# Altium schematic symbol library LATTICEPLDS_Library.SchLib: 291 symbols (part 24 of 32)
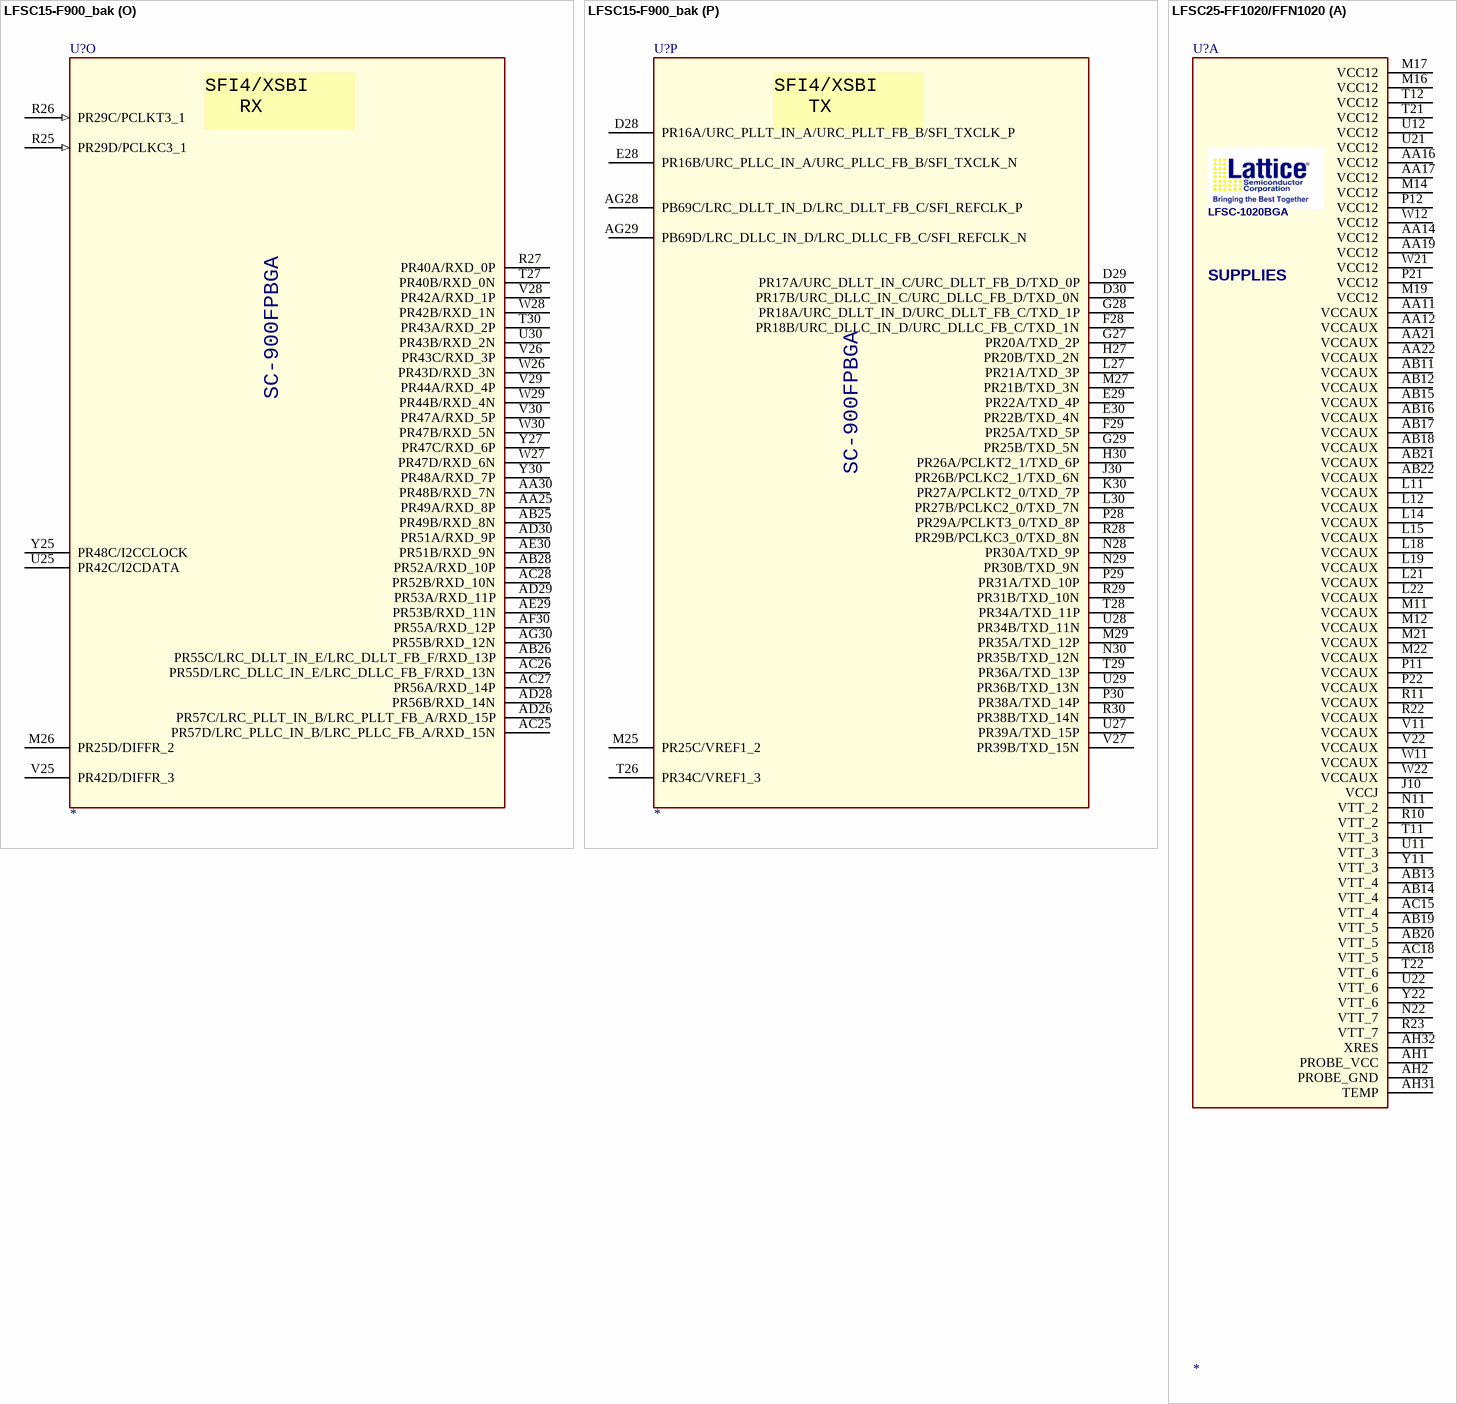
[diagram p326: symbols LFSC15-F900_bak to LFSC25-FF1020/FFN1020]

## LFSC15-F900_bak
designator U?
footprint 1mm-900bga
part A pins: A3 A_HDOUTP0_L (io), A4 A_HDOUTN0_L (io), A5 A_HDOUTN1_L (io), A6 A_HDOUTP1_L (io), A7 A_HDOUTP2_L (io), A8 A_HDOUTN2_L (io), A9 A_HDOUTN3_L (io), A10 A_HDOUTP3_L (io), A17 PT42A/EXTDONEI (io), A21 A_HDOUTP3_R (io), A22 A_HDOUTN3_R (io), A23 A_HDOUTN2_R (io), A24 A_HDOUTP2_R (io), A25 A_HDOUTP1_R (io), A26 A_HDOUTN1_R (io), A27 A_HDOUTN0_R (io), A28 A_HDOUTP0_R (io), B1 A_REFCLKP_L (in), B2 A_RXREFCLKP_L (in), B3 A_HDINP0_L (io), B4 A_HDINN0_L (io), B5 A_HDINN1_L (io), B6 A_HDINP1_L (io), B7 A_HDINP2_L (io), B8 A_HDINN2_L (io), B9 A_HDINN3_L (io), B10 A_HDINP3_L (io), B21 A_HDINP3_R (io), B22 A_HDINN3_R (io), B23 A_HDINN2_R (io), B24 A_HDINP2_R (io), B25 A_HDINP1_R (io), B26 A_HDINN1_R (io), B27 A_HDINN0_R (io), B28 A_HDINP0_R (io), B29 A_RXREFCLKP_R (in), B30 A_REFCLKP_R (in), C1 A_REFCLKN_L (in), C2 A_RXREFCLKN_L (in), C29 A_RXREFCLKN_R (in), C30 A_REFCLKN_R (in), D16 PT39A/EXTCLKP2I (io), D17 PT39B/EXTCLKP2O (io), F17 PT38D/EXTDONEO (io), H17 PT41A/EXTCLKP1I (io), H18 PT41B/EXTCLKP1O (io)
part B pins: C3 A_VDDIB0_L (power), C4 A_VDDOB0_L (power), C5 A_VDDOB1_L (power), C6 A_VDDIB1_L (power), C7 A_VDDIB2_L (power), C8 A_VDDOB2_L (power), C9 A_VDDOB3_L (power), C10 A_VDDIB3_L (power), C21 A_VDDIB3_R (power), C22 A_VDDOB3_R (power), C23 A_VDDOB2_R (power), C24 A_VDDIB2_R (power), C25 A_VDDIB1_R (power), C26 A_VDDOB1_R (power), C27 A_VDDOB0_R (power), C28 A_VDDIB0_R (power), D5 A_VDDP_L (power), D6 A_VDDRX0_L (power), D7 A_VDDTX1_L (power), D8 A_VDDRX2_L (power), D9 A_VDDTX3_L (power), D22 A_VDDTX3_R (power), D23 A_VDDRX2_R (power), D24 A_VDDTX1_R (power), D25 A_VDDRX0_R (power), D26 A_VDDP_R (power), E6 A_VDDTX0_L (power), E7 A_VDDRX1_L (power), E8 A_VDDTX2_L (power), E9 A_VDDRX3_L (power), E22 A_VDDRX3_R (power), E23 A_VDDTX2_R (power), E24 A_VDDRX1_R (power), E25 A_VDDTX0_R (power), F7 A_VDDAX25_L (power), F24 A_VDDAX25_R (power)
part C pins: AA4 VCCIO6 (power), AA7 VCCIO6 (power), AA8 VCCIO6 (power), AA23 VCCIO3 (power), AA24 VCCIO3 (power), AA26 VCCIO3 (power), AA29 VCCIO3 (power), AB2 VCCIO6 (power), AB7 VCCIO6 (power), AB8 VCCIO6 (power), AB11 VCCIO5 (power), AB12 VCCIO5 (power), AB13 VCCIO5 (power), AB14 VCCIO5 (power), AB15 VCCIO5 (power), AB16 VCCIO4 (power), AB17 VCCIO4 (power), AB18 VCCIO4 (power), AB19 VCCIO4 (power), AB20 VCCIO4 (power), AB23 VCCIO3 (power), AB24 VCCIO3 (power), AC9 VCCIO5 (power), AC10 VCCIO5 (power), AC11 VCCIO5 (power), AC20 VCCIO4 (power), AC21 VCCIO4 (power), AC22 VCCIO4 (power), AC29 VCCIO3 (power), AD1 VCCIO6 (power), AD9 VCCIO5 (power), AD10 VCCIO5 (power), AD11 VCCIO5 (power), AD20 VCCIO4 (power), AD21 VCCIO4 (power), AD22 VCCIO4 (power), AE7 VCCIO5 (power), AG11 VCCIO5 (power), AG20 VCCIO4 (power), AG23 VCCIO4 (power), AH6 VCCIO5 (power), AJ9 VCCIO5 (power), AJ23 VCCIO4 (power), AJ26 VCCIO4 (power), C12 VCCIO1 (power), C19 VCCIO1 (power), F11 VCCIO1 (power), F20 VCCIO1 (power), G30 VCCIO2 (power), H2 VCCIO7 (power), H4 VCCIO7 (power), H9 VCCIO1 (power), H10 VCCIO1 (power), H21 VCCIO1 (power), H22 VCCIO1 (power), J2 VCCIO7 (power), J7 VCCIO7 (power), J8 VCCIO7 (power), J11 VCCIO1 (power), J12 VCCIO1 (power), J13 VCCIO1 (power), J14 VCCIO1 (power), J15 VCCIO1 (power), J16 VCCIO1 (power), J17 VCCIO1 (power), J18 VCCIO1 (power), J19 VCCIO1 (power), J20 VCCIO1 (power), J23 VCCIO2 (power), J24 VCCIO2 (power), J29 VCCIO2 (power), K7 VCCIO7 (power), K8 VCCIO7 (power), K23 VCCIO2 (power), K24 VCCIO2 (power), K27 VCCIO2 (power), L2 VCCIO7 (power), L8 VCCIO7 (power), L9 VCCIO7 (power), L22 VCCIO2 (power), L23 VCCIO2 (power), M9 VCCIO7 (power), M22 VCCIO2 (power), N4 VCCIO7 (power), N6 VCCIO7 (power), N9 VCCIO7 (power), N22 VCCIO2 (power), N25 VCCIO2 (power), P9 VCCIO7 (power), P22 VCCIO2 (power), R9 VCCIO7 (power), R22 VCCIO2 (power), T9 VCCIO6 (power), T22 VCCIO3 (power), U9 VCCIO6 (power), U22 VCCIO3 (power), V9 VCCIO6 (power), V22 VCCIO3 (power), W4 VCCIO6 (power), W9 VCCIO6 (power), W22 VCCIO3 (power), Y7 VCCIO6 (power), Y8 VCCIO6 (power), Y9 VCCIO6 (power), Y22 VCCIO3 (power), Y23 VCCIO3 (power), Y24 VCCIO3 (power), Y28 VCCIO3 (power)
part D pins: A2 RESP_ULC (io), A29 RESP_URC (io), AB9 VCC1P2 (power), AB22 VCC1P2 (power), AC8 VCC1P2 (power), AC23 VCC1P2 (power), AD27 PROBE_VCC (io), AE4 XRES (io), AE28 PROBE_GND (io), AF5 VCCL_LLC_B (power), AF26 VCCL_LRC_B (power), AG4 VCCL_LLC_A (power), AG27 VCCL_LRC_A (power), D4 VCCL_ULC_B (power), D27 VCCL_URC_B (power), E5 VCCL_ULC_A (power), E26 VCCL_URC_A (power), H8 VCC1P2 (power), H15 VCC1P2 (power), H23 VCC1P2 (power), J25 VCCJ (power), R23 VCC1P2 (power), T8 VCC1P2 (power)
part E pins: AA9 VCC (power), AA10 VCC (power), AA11 VCC (power), AA12 VCC (power), AA13 VCC (power), AA14 VCC (power), AA17 VCC (power), AA18 VCC (power), AA19 VCC (power), AA20 VCC (power), AA21 VCC (power), AA22 VCC (power), AB10 VCC (power), AB21 VCC (power), J9 VCC (power), J10 VCC (power), J21 VCC (power), J22 VCC (power), K9 VCC (power), K10 VCC (power), K11 VCC (power), K12 VCC (power), K13 VCC (power), K14 VCC (power), K17 VCC (power), K18 VCC (power), K19 VCC (power), K20 VCC (power), K21 VCC (power), K22 VCC (power), L10 VCC (power), L21 VCC (power), M10 VCC (power), M21 VCC (power), N10 VCC (power), N21 VCC (power), P10 VCC (power), P21 VCC (power), U10 VCC (power), U21 VCC (power), V10 VCC (power), V21 VCC (power), W10 VCC (power), W21 VCC (power), Y10 VCC (power), Y21 VCC (power)
part F pins: A1 GND (power), A12 GND (power), A30 GND (power), AA3 GND (power), AA5 GND (power), AA15 GND (power), AA16 GND (power), AA27 GND (power), AB4 GND (power), AB29 GND (power), AC2 GND (power), AC30 GND (power), AE1 GND (power), AE6 GND (power), AE8 GND (power), AE27 GND (power), AF11 GND (power), AF20 GND (power), AF22 GND (power), AF23 GND (power), AG6 GND (power), AG9 GND (power), AG12 GND (power), AH5 GND (power), AJ10 GND (power), AJ22 GND (power), AJ25 GND (power), AJ27 GND (power), AK1 GND (power), AK26 GND (power), AK30 GND (power), C11 GND (power), C20 GND (power), D10 GND (power), D11 GND (power), D20 GND (power), D21 GND (power), E10 GND (power), E11 GND (power), E18 GND (power), E20 GND (power), E21 GND (power), E27 GND (power), F8 GND (power), F10 GND (power), F21 GND (power), F23 GND (power), F27 GND (power), F30 GND (power), G4 GND (power), G8 GND (power), G23 GND (power), H1 GND (power), H3 GND (power), H7 GND (power), H29 GND (power), J27 GND (power), K2 GND (power), K15 GND (power), K16 GND (power), K29 GND (power), L4 GND (power), L11 GND (power), L12 GND (power), L13 GND (power), L14 GND (power), L15 GND (power), L16 GND (power), L17 GND (power), L18 GND (power), L19 GND (power), L20 GND (power), M2 GND (power), M3 GND (power), M11 GND (power), M12 GND (power), M13 GND (power), M14 GND (power), M15 GND (power), M16 GND (power), M17 GND (power), M18 GND (power), M19 GND (power), M20 GND (power), M28 GND (power), N5 GND (power), N11 GND (power), N12 GND (power), N13 GND (power), N14 GND (power), N15 GND (power), N16 GND (power), N17 GND (power), N18 GND (power), N19 GND (power), N20 GND (power), N26 GND (power), P6 GND (power), P11 GND (power), P12 GND (power), P13 GND (power), P14 GND (power), P15 GND (power), P16 GND (power), P17 GND (power), P18 GND (power), P19 GND (power), P20 GND (power), P25 GND (power), R10 GND (power), R11 GND (power), R12 GND (power), R13 GND (power), R14 GND (power), R15 GND (power), R16 GND (power), R17 GND (power), R18 GND (power), R19 GND (power), R20 GND (power), R21 GND (power), R24 GND (power), T10 GND (power), T11 GND (power), T12 GND (power), T13 GND (power), T14 GND (power), T15 GND (power), T16 GND (power), T17 GND (power), T18 GND (power), T19 GND (power), T20 GND (power), T21 GND (power), U11 GND (power), U12 GND (power), U13 GND (power), U14 GND (power), U15 GND (power), U16 GND (power), U17 GND (power), U18 GND (power), U19 GND (power), U20 GND (power), V11 GND (power), V12 GND (power), V13 GND (power), V14 GND (power), V15 GND (power), V16 GND (power), V17 GND (power), V18 GND (power), V19 GND (power), V20 GND (power), W11 GND (power), W12 GND (power), W13 GND (power), W14 GND (power), W15 GND (power), W16 GND (power), W17 GND (power), W18 GND (power), W19 GND (power), W20 GND (power), Y4 GND (power), Y11 GND (power), Y12 GND (power), Y13 GND (power), Y14 GND (power), Y15 GND (power), Y16 GND (power), Y17 GND (power), Y18 GND (power), Y19 GND (power), Y20 GND (power), Y26 GND (power), Y29 GND (power)
part G pins: A11 NC19, AA28 NC9, AB3 NC4, AB30 NC22, AC16 NC21, AF12 NC23, AG7 NC6, AG10 NC24, AH9 NC5, AH24 NC25, AH25 NC26, AH26 NC27, AH27 NC28, AJ24 NC8, AK27 NC7, E19 NC14, F9 NC18, G7 NC20, G19 NC17, G20 NC16, G21 NC15, J3 NC3, K28 NC11, L28 NC13, M4 NC1, P5 NC2, P23 NC12, P24 NC10
part H pins: AA6 VTT_6 (power), AC15 VTT_5 (power), AC24 VTT_3 (power), AD16 VTT_5 (power), AD24 VTT_4 (power), AE9 VTT_5 (power), AE17 VTT_4 (power), AE18 VTT_4 (power), L7 VTT_7 (power), L24 VTT_2 (power), P7 VTT_7 (power), T7 VTT_6 (power), T23 VTT_2 (power), T25 VTT_3 (power), W6 VTT_6 (power), W25 VTT_3 (power)
part I pins: A18 PT42B/DOUT (io), AD5 TEMP (io), B17 PT43A/QOUT (io), E4 M3 (in), F4 M2 (in), F5 M0 (in), F6 M1 (in), F16 PT38C/RDY (io), F22 PT49C/LDCN (io), F25 CCLK (io), F26 PROGRAMN (in), G5 INITN (io), G6 DONE (io), G16 PT42D/VREF2_1 (in), G22 PT49D/HDC (io), G24 TDI (io), G25 TCK (io), H5 RESETN (in), H6 RDCFGN (io), H16 PT35D/DP3/PCLKC1_4/MPIWRPARITY3 (in), H25 TDO (io), J26 TMS (io)
part J pins: AD6 PB4C/MC_ADDR2 (io), AD7 PB5C/MC_ADDR5 (io), AD8 PB5D/VREF1_5/MC_ADDR6 (io), AD15 PB31C/MC_DQ25 (io), AD23 PB57A/MC_DQ60 (io), AE5 PB3D/LLC_DLLC_IN_C/LLC_DLLC_FB_D/MC_WE# (io), AE10 PB11D/MC_BA1 (io), AE11 PB13A/MC_DQ1 (io), AE12 PB15C/MC_DQ5 (io), AE13 PB15D/MC_DQ6 (io), AE14 PB20D/PCLKC5_4/MC_DQ13 (io), AE15 PB31D/MC_DQ26 (io), AE16 PB38C/MC_DQ35 (io), AE19 PB52C/PCLKT4_4/MC_DQ52 (io), AE20 PB52D/PCLKC4_4/MC_DQ53 (io), AE21 PB53A/MC_DQ54 (io), AE23 PB57B/MC_DQ61 (io), AE24 PB67C/VREF1_4 (io), AF4 PB3C/LLC_DLLT_IN_C/LLC_DLLT_FB_D/MC_CAS# (io), AF6 PB7B/MC_ADDR8 (io), AF7 PB7A/MC_ADDR7 (io), AF8 PB9A/MC_ADDR11 (io), AF9 PB11C/MC_BA0 (io), AF10 PB13B/MC_DQ2 (io), AF13 PB20C/PCLKT5_4/MC_DQS1 (io), AF14 PB21C/DIFFR_5/MC_DQ14 (io), AF15 PB21D/MC_DQ15 (io), AF16 PB38D/MC_DQ38 (io), AF17 PB42C/MC_DQ42 (io), AF18 PB47A/PCLKT4_1/MC_DQS5 (io), AF19 PB49D/MC_DQ48 (io), AF21 PB53B/MC_DQ55 (io), AF25 PB64B/MC_DQ71 (io), AF27 PB65B/MC_CS3# (io), AG3 PB4A/LLC_DLLT_IN_D/LLC_DLLT_FB_C/MC_ADDR0 (io), AG5 PB8B/MC_ADDR10 (io), AG8 PB9B/MC_ADDR12 (io), AG13 PB23C/MC_DQ16 (io), AG14 PB25B/PCLKC5_2/MC_DQ19 (io), AG15 PB29B/MC_DQ23 (io), AG16 PB39B/MC_DQ37 (io), AG17 PB42D/MC_DQ43 (io), AG18 PB47B/PCLKC4_1/MC_DQ47 (io), AG19 PB49C/VREF2_4/MC_VREF2 (io), AG21 PB55A/MC_DM7 (io), AG22 PB55B/MC_DQ56 (io), AG25 PB64A/MC_DQ70 (io), AG26 PB65A/MC_CS2# (io), AH1 PB3A/LLC_PLLT_IN_A/LLC_PLLT_FB_B/MC_REFCLK (io), AH2 PB4B/LLC_DLLC_IN_D/LLC_DLLC_FB_C/MC_ADDR1 (io), AH3 PB11A/MC_CS1# (io), AH4 PB8A/MC_ADDR9 (io), AH7 PB15A/MC_DQ3 (io), AH8 PB15B/MC_DQ4 (io), AH10 PB20A/PCLKT5_3/MC_DQS0 (io), AH11 PB20B/PCLKC5_3/MC_DQ12 (io), AH12 PB31A/MC_DM3 (io), AH13 PB23D/VREF2_5/MC_VREF1 (io), AH14 PB25A/PCLKT5_2/MC_DQ18 (io), AH15 PB29A/MC_DQ22 (io), AH16 PB39A/MC_DQ36 (io), AH17 PB42A/MC_DQ40 (io), AH18 PB42B/MC_DQ41 (io), AH19 PB51C/DIFFR_4/MC_DQ50 (io), AH20 PB51D/MC_DQ51 (io), AH21 PB56C/MC_DQ59 (io), AH22 PB56A/MC_DQ57 (io), AH23 PB56B/MC_DQ58 (io), AJ1 PB3B/LLC_PLLC_IN_A/LLC_PLLC_FB_B/MC_RAS# (io), AJ2 PB5A/MC_ADDR3 (io), AJ3 PB11B/MC_CS0# (io), AJ4 PB12B/MC_DQ0 (io), AJ5 PB17A/MC_DQ8 (io), AJ6 PB17B/MC_DQ9 (io), AJ7 PB19A/MC_DQ10 (io), AJ8 PB19B/MC_DQ11 (io), AJ11 PB23A/PCLKT5_0/MC_DQS2 (io), AJ12 PB23B/PCLKC5_0/MC_DM2 (io), AJ13 PB31B/MC_DQ24 (io), AJ14 PB33A/MC_DQ29 (io), AJ15 PB33B/MC_DQ30 (io), AJ16 PB38A/MC_DQ33 (io), AJ17 PB38B/MC_DQ34 (io), AJ18 PB43A/MC_DQ44 (io), AJ19 PB43B/MC_DQ45 (io), AJ20 PB49A/PCLKT4_0/MC_DQS6 (io), AJ21 PB49B/PCLKC4_0/MC_DM6 (io), AK2 PB5B/MC_ADDR4 (io), AK3 PB12A/MC_DM0 (io), AK4 PB16A/MC_DQ7 (io), AK5 PB16B/MC_DM1 (io), AK6 PB21A/PCLKT5_5/MC_ODT_0 (io), AK7 PB21B/PCLKC5_5/MC_ODT_1 (io), AK8 PB24A/PCLKT5_1/MC_DQS3 (io), AK9 PB24B/PCLKC5_1/MC_DQ17 (io), AK10 PB28A/MC_DQ20 (io), AK11 PB28B/MC_DQ21 (io), AK12 PB32A/MC_DQ27 (io), AK13 PB32B/MC_DQ28 (io), AK14 PB35A/MC_DQ31 (io), AK16 PB37A/MC_DM4 (io), AK17 PB37B/MC_DQ32 (io), AK18 PB41A/MC_DQ39 (io), AK19 PB41B/MC_DM5 (io), AK20 PB46A/PCLKT4_2/MC_DQS4 (io), AK21 PB46B/PCLKC4_2/MC_DQ46 (io), AK22 PB51A/PCLKT4_5/MC_DQS7 (io), AK23 PB51B/PCLKC4_5/MC_DQ49 (io), AK24 PB52A/PCLKT4_3/MC_K (io), AK25 PB52B/PCLKC4_3/MC_K# (io)
part K pins: A13 PT28A/A12/MPIADDR26 (io), A14 PT28B/A11/MPIADDR25 (io), A15 PT35A/A0/MPIADDR14 (io), A16 PT35B/MPIRTRYN/MPIRETRY (io), A19 PT47C/D10/MPIWRDATA10 (io), A20 PT47D/D9/MPIWRDATA9 (io), B11 PT24A/MPITEAN/MPITEA (io), B12 PT24B/A18/MPITSIZ0 (io), B13 PT31A/A8/MPIADDR22 (io), B14 PT31B/A7/MPIADDR21 (io), B15 PT37A/MPICLK/PCLKT1_0/MPICLK (io), B18 PT43B/D0/MPIWRDATA0 (io), B19 PT49A/CS1/CS1 (io), B20 PT49B/D8/MPIWRDATA8 (io), C13 PT32A/A6/MPIADDR20 (io), C14 PT32B/A5/MPIADDR19 (io), C15 PT38A/MPIACKN/MPITA (io), C16 PT38B/DP0/MPIWRPARITY0 (io), C17 PT46A/D5/MPIWRDATA5 (io), C18 PT46B/D6/MPIWRDATA6 (io), D12 PT23C/DP1/MPIWRPARITY1 (io), D13 PT25A/A17/MPIADDR31 (io), D14 PT25B/A15/MPIADDR29 (io), D15 PT33A/A4/MPIADDR18 (io), D18 PT47A/RDN/MPISTRBN (io), D19 PT47B/CS0N/CS0N (io), E12 PT23D/D14/MPIWRDATA14 (io), E13 PT27A/A14/MPIADDR28 (io), E14 PT27B/A13/MPIADDR27 (io), E15 PT33B/A3/MPIADDR17 (io), E16 PT45C/D3/MPIWRDATA3 (io), E17 PT45D/D4/MPIWRDATA4 (io), F12 PT24D/A19/MPITSIZ1 (io), F13 PT24C/A20/MPIBDIP (io), F14 PT29A/A10/MPIADDR24 (io), F15 PT33C/A2/MPIADDR16 (io), F18 PT46C/D7/MPIWRDATA7 (io), F19 PT46D/WRN/MPIRWN (io), G9 PT23A/D15/MPIWRDATA15 (io), G10 PT23B/A21/MPIBURST (io), G11 PT25C/D13/MPIWRDATA13 (io), G12 PT25D/A16/MPIADDR30 (io), G13 PT27D/D11/MPIWRDATA11 (io), G14 PT29B/A9/MPIADDR23 (io), G15 PT33D/A1/MPIADDR15 (io), G17 PT45A/D1/MPIWRDATA1 (io), G18 PT45B/D2/MPIWRDATA2 (io), H13 PT27C/D12/MPIWRDATA12 (io), H24 MPIIRQN (io)
part L pins: AC12 VCCAUX5 (power), AC13 VCCAUX5 (power), AC14 VCCAUX5 (power), AC17 VCCAUX4 (power), AC18 VCCAUX4 (power), AC19 VCCAUX4 (power), AD12 VCCAUX5 (power), AD13 VCCAUX5 (power), AD14 VCCAUX5 (power), AD17 VCCAUX4 (power), AD18 VCCAUX4 (power), AD19 VCCAUX4 (power), H11 VCCAUX1 (power), H12 VCCAUX1 (power), H19 VCCAUX1 (power), H20 VCCAUX1 (power), M7 VCCAUX7 (power), M8 VCCAUX7 (power), M23 VCCAUX2 (power), M24 VCCAUX2 (power), N7 VCCAUX7 (power), N8 VCCAUX7 (power), N23 VCCAUX2 (power), N24 VCCAUX2 (power), U7 VCCAUX6 (power), U8 VCCAUX6 (power), U23 VCCAUX3 (power), U24 VCCAUX3 (power), V7 VCCAUX6 (power), V8 VCCAUX6 (power), V23 VCCAUX3 (power), V24 VCCAUX3 (power), W7 VCCAUX6 (power), W8 VCCAUX6 (power), W23 VCCAUX3 (power), W24 VCCAUX3 (power)
part M pins: AB5 PL51D/VREF2_6/MC_CS4# (io), AB27 PR51D/VREF2_3 (io), AD25 PB68D (io), AE22 PB60C (io), AE25 PB67D (io), AE26 PB68C (io), AF24 PB63A/MC_DQ68 (io), AF28 PR57B/LRC_DLLC_IN_F/LRC_DLLC_FB_E, AF29 PR57A/LRC_DLLT_IN_F/LRC_DLLT_FB_E, AG24 PB63B/MC_DQ69 (io), AH28 PB67B (io), AH29 PB68B/LRC_DLLC_IN_C/LRC_DLLC_FB_D (io), AH30 PB69B/LRC_PLLC_IN_A/LRC_PLLC_FB_B (io), AJ28 PB67A (io), AJ29 PB68A/LRC_DLLT_IN_C/LRC_DLLT_FB_D (io), AJ30 PB69A/LRC_PLLT_IN_A/LRC_PLLT_FB_B (io), AK15 PB35B (io), AK28 PB60A/MC_DM8 (io), AK29 PB60B (io), B16 PT37B/PCLKC1_0 (io), G26 PR16D (io), H14 PT31C/VREF1_1 (io), H26 PR16C (io), H28 PR22D (io), J28 PR22C (io), K25 PR17C/URC_PLLT_IN_B/URC_PLLT_FB_A (in), K26 PR17D/URC_PLLC_IN_B/URC_PLLC_FB_A (in), L25 PR18C (io), L26 PR18D/VREF2_2 (io), L29 PR31C/PCLKT3_2 (io), M30 PR31D/PCLKC3_2 (io), N27 PR27D/PCLKC2_2 (io), P26 PR27C/PCLKT2_2 (io), P27 PR30C/PCLKT3_3 (io), T24 PR35C (io), U26 PR34D (io), W5 PL48C/MC_CS5# (io)
part N pins: AA1 PL44B/SPI_IN_DATN12 (io), AA2 PL47B/SPI_OUT_DATN15 (io), AB1 PL48A/SPI_OUT_TCTLP (io), AB6 PL55C/LLC_DLLT_IN_E/LLC_DLLT_FB_F/SPI_TSTATP0 (io), AC1 PL48B/SPI_OUT_TCTLN (io), AC3 PL52A/SPI_IN_RCTLP (io), AC4 PL53A/SPI_RSTATP0 (io), AC5 PL55D/LLC_DLLC_IN_E/LLC_DLLC_FB_F/SPI_TSTATN0 (io), AC6 PL57C/LLC_PLLT_IN_B/LLC_PLLT_FB_A/SPI_TSCLKP (io), AC7 PL57D/LLC_PLLC_IN_B/LLC_PLLC_FB_A/SPI_TSCLKN (io), AD2 PL51A/SPI_IN_DATP15 (io), AD3 PL52B/SPI_IN_RCTLN (io), AD4 PL53B/SPI_RSTATN0 (io), AE2 PL51B/SPI_IN_DATN15 (io), AE3 PL56A/SPI_TSTATP1 (io), AF1 PL55A/SPI_RSTATP1 (io), AF2 PL57A/LLC_DLLT_IN_F/LLC_DLLT_FB_E/SPI_RSCLKP (io), AF3 PL56B/SPI_TSTATN1, AG1 PL55B/SPI_RSTATN1, AG2 PL57B/LLC_DLLC_IN_F/LLC_DLLC_FB_E/SPI_RSCLKN (io), D1 PL22D/SPI_IN_DATN3 (io), D2 PL16B/ULC_PLLC_IN_A/ULC_PLLC_FB_B/DEBUG_BUS10/SPI_OUT_DATN0 (io), D3 PL16A/ULC_PLLT_IN_A/ULC_PLLT_FB_B/DEBUG_BUS11/SPI_OUT_DATP0 (io), E1 PL22C/SPI_IN_DATP3 (io), E2 PL17B/ULC_DLLC_IN_C/ULC_DLLC_FB_D/DEBUG_BUS8/SPI_OUT_DATN1 (io), E3 PL17A/ULC_DLLT_IN_C/ULC_DLLT_FB_D/DEBUG_BUS9/SPI_OUT_DATP1 (io), F1 PL22B/SPI_OUT_DATN5 (io), F2 PL22A/SPI_OUT_DATP5 (io), F3 PL18A/ULC_DLLT_IN_D/ULC_DLLT_FB_C/SPI_OUT_DATP2 (io), G1 PL20B/SPI_OUT_DATN3 (io), G2 PL20A/SPI_OUT_DATP3 (io), G3 PL18B/ULC_DLLC_IN_D/ULC_DLLC_FB_C/SPI_OUT_DATN2 (io), J1 PL26A/PCLKT7_1/DEBUG_BUS3/SPI_OUT_DATP6 (io), J4 PL17D/ULC_PLLC_IN_B/ULC_PLLC_FB_A/SPI_IN_DATN1 (io), J5 PL16D/SPI_IN_DATN0 (io), J6 PL16C/DEBUG_BUS13/SPI_IN_DATP0 (io), K1 PL26B/PCLKC7_1/DEBUG_BUS2/SPI_OUT_DATN6 (io), K3 PL25A/TESTCFGN/SPI_OUT_DATP4 (io), K4 PL17C/ULC_PLLT_IN_B/ULC_PLLT_FB_A/SPI_IN_DATP1 (io), K5 PL18C/DEBUG_BUS12/SPI_IN_DATP2 (io), K6 PL18D/VREF2_7/DEBUG_BUS6/SPI_IN_DATN2 (io), L1 PL27A/PCLKT7_0/DEBUG_BUS1/SPI_OUT_TDCLKP (io), L3 PL25B/DEBUG_BUS7/SPI_OUT_DATN4 (io), L5 PL21A/SPI_IN_DATP4 (io), L6 PL25C/VREF1_7/DEBUG_BUS5 (io), M1 PL27B/PCLKC7_0/DEBUG_BUS0/SPI_OUT_TDCLKN (io), M5 PL21B/SPI_IN_DATN4 (io), M6 PL25D/DIFFR_7/DEBUG_BUS4 (io), N1 PL29B/PCLKC6_0/SPI_OUT_DATN7 (io), N2 PL29A/PCLKT6_0/SPI_OUT_DATP7 (io), N3 PL30A/SPI_OUT_DATP8 (io), P1 PL34A/SPI_OUT_DATP10 (io), P2 PL31A/SPI_OUT_DATP9 (io), P3 PL30B/SPI_OUT_DATN8 (io), P4 PL30C/PCLKT6_3/SPI_REFCLKIN (io), P8 PL27C/PCLKT7_2/DEBUG_BUS14/SPI_IN_RDCLKP (io), R1 PL34B/SPI_OUT_DATN10 (io), R2 PL31B/SPI_OUT_DATN9 (io), R3 PL31D/PCLKC6_2/SPI_IN_DATN6 (io), R4 PL34D/SPI_IN_DATN7 (io), R5 PL34C/VREF1_6/SPI_IN_DATP7 (io), R6 PL29D/PCLKC6_1/SPI_IN_DATN5 (io), R7 PL29C/PCLKT6_1/SPI_IN_DATP5 (io), R8 PL27D/PCLKC7_2/DEBUG_BUS15/SPI_IN_RDCLKN (io), T1 PL38A/SPI_OUT_DATP12 (io), T2 PL35A/SPI_OUT_DATP11 (io), T3 PL31C/PCLKT6_2/SPI_IN_DATP6 (io), T4 PL39B/SPI_IN_DATN9 (io), T5 PL39A/SPI_IN_DATP9 (io), T6 PL35C/VREF2 (io), U1 PL38B/SPI_OUT_DATN12 (io), U2 PL35B/SPI_OUT_DATN11 (io), U3 PL36A/SPI_IN_DATP8 (io), U4 PL40A/SPI_OUT_DATP13 (io), U5 PL40B/SPI_OUT_DATN13 (io), U6 PL42C/VREF_REFCLK (io), V1 PL42A/SPI_IN_DATP10 (io), V2 PL43A/SPI_OUT_DATP14 (io), V3 PL36B/SPI_IN_DATN8 (io), V4 PL43D/SPI_IN_DATN11 (io), V5 PL43C/SPI_IN_DATP11 (io), V6 PL42D/DIFFR_6 (io), W1 PL42B/SPI_IN_DATN10 (io), W2 PL43B/SPI_OUT_DATN14 (io), W3 PL47D/SPI_IN_DATN13 (io), Y1 PL44A/SPI_IN_DATP12 (io), Y2 PL47A/SPI_OUT_DATP15 (io), Y3 PL47C/SPI_IN_DATP13 (io), Y5 PL49A/SPI_IN_DATP14 (io), Y6 PL49B/SPI_IN_DATN14 (io)
part O pins: AA25 PR49A/RXD_8P, AA30 PR48B/RXD_7N, AB25 PR49B/RXD_8N, AB26 PR55C/LRC_DLLT_IN_E/LRC_DLLT_FB_F/RXD_13P, AB28 PR52A/RXD_10P, AC25 PR57D/LRC_PLLC_IN_B/LRC_PLLC_FB_A/RXD_15N, AC26 PR55D/LRC_DLLC_IN_E/LRC_DLLC_FB_F/RXD_13N, AC27 PR56A/RXD_14P, AC28 PR52B/RXD_10N, AD26 PR57C/LRC_PLLT_IN_B/LRC_PLLT_FB_A/RXD_15P, AD28 PR56B/RXD_14N, AD29 PR53A/RXD_11P, AD30 PR51A/RXD_9P, AE29 PR53B/RXD_11N, AE30 PR51B/RXD_9N, AF30 PR55A/RXD_12P, AG30 PR55B/RXD_12N, M26 PR25D/DIFFR_2, R25 PR29D/PCLKC3_1 (in), R26 PR29C/PCLKT3_1 (in), R27 PR40A/RXD_0P, T27 PR40B/RXD_0N, T30 PR43A/RXD_2P, U25 PR42C/I2CDATA, U30 PR43B/RXD_2N, V25 PR42D/DIFFR_3, V26 PR43C/RXD_3P, V28 PR42A/RXD_1P, V29 PR44A/RXD_4P, V30 PR47A/RXD_5P, W26 PR43D/RXD_3N, W27 PR47D/RXD_6N, W28 PR42B/RXD_1N, W29 PR44B/RXD_4N, W30 PR47B/RXD_5N, Y25 PR48C/I2CCLOCK, Y27 PR47C/RXD_6P, Y30 PR48A/RXD_7P
part P pins: AG28 PB69C/LRC_DLLT_IN_D/LRC_DLLT_FB_C/SFI_REFCLK_P, AG29 PB69D/LRC_DLLC_IN_D/LRC_DLLC_FB_C/SFI_REFCLK_N, D28 PR16A/URC_PLLT_IN_A/URC_PLLT_FB_B/SFI_TXCLK_P, D29 PR17A/URC_DLLT_IN_C/URC_DLLT_FB_D/TXD_0P, D30 PR17B/URC_DLLC_IN_C/URC_DLLC_FB_D/TXD_0N, E28 PR16B/URC_PLLC_IN_A/URC_PLLC_FB_B/SFI_TXCLK_N, E29 PR22A/TXD_4P, E30 PR22B/TXD_4N, F28 PR18B/URC_DLLC_IN_D/URC_DLLC_FB_C/TXD_1N, F29 PR25A/TXD_5P, G27 PR20A/TXD_2P, G28 PR18A/URC_DLLT_IN_D/URC_DLLT_FB_C/TXD_1P, G29 PR25B/TXD_5N, H27 PR20B/TXD_2N, H30 PR26A/PCLKT2_1/TXD_6P, J30 PR26B/PCLKC2_1/TXD_6N, K30 PR27A/PCLKT2_0/TXD_7P, L27 PR21A/TXD_3P, L30 PR27B/PCLKC2_0/TXD_7N, M25 PR25C/VREF1_2, M27 PR21B/TXD_3N, M29 PR35A/TXD_12P, N28 PR30A/TXD_9P, N29 PR30B/TXD_9N, N30 PR35B/TXD_12N, P28 PR29A/PCLKT3_0/TXD_8P, P29 PR31A/TXD_10P, P30 PR38A/TXD_14P, R28 PR29B/PCLKC3_0/TXD_8N, R29 PR31B/TXD_10N, R30 PR38B/TXD_14N, T26 PR34C/VREF1_3, T28 PR34A/TXD_11P, T29 PR36A/TXD_13P, U27 PR39A/TXD_15P, U28 PR34B/TXD_11N, U29 PR36B/TXD_13N, V27 PR39B/TXD_15N

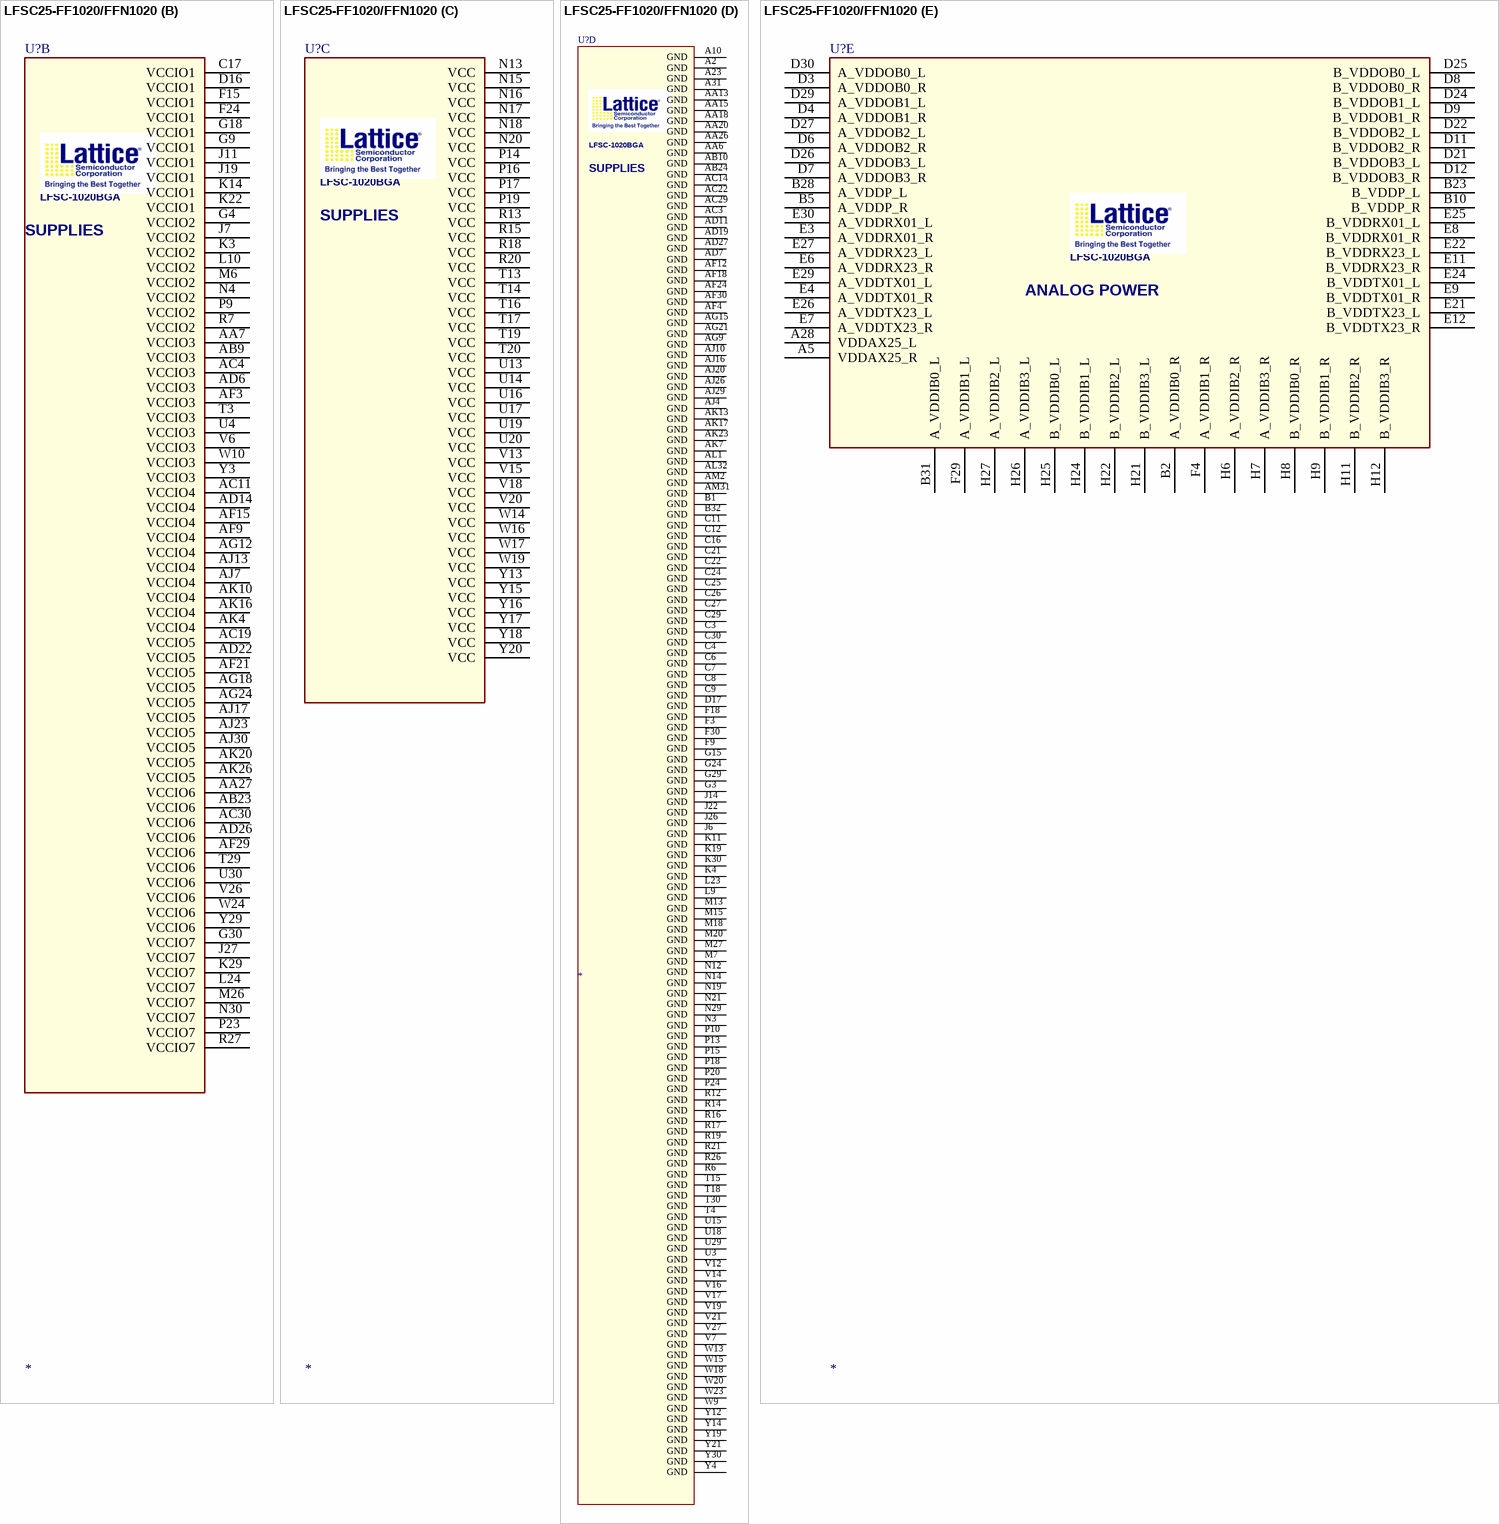
[diagram p233: symbol LFSC25-FF1020/FFN1020]

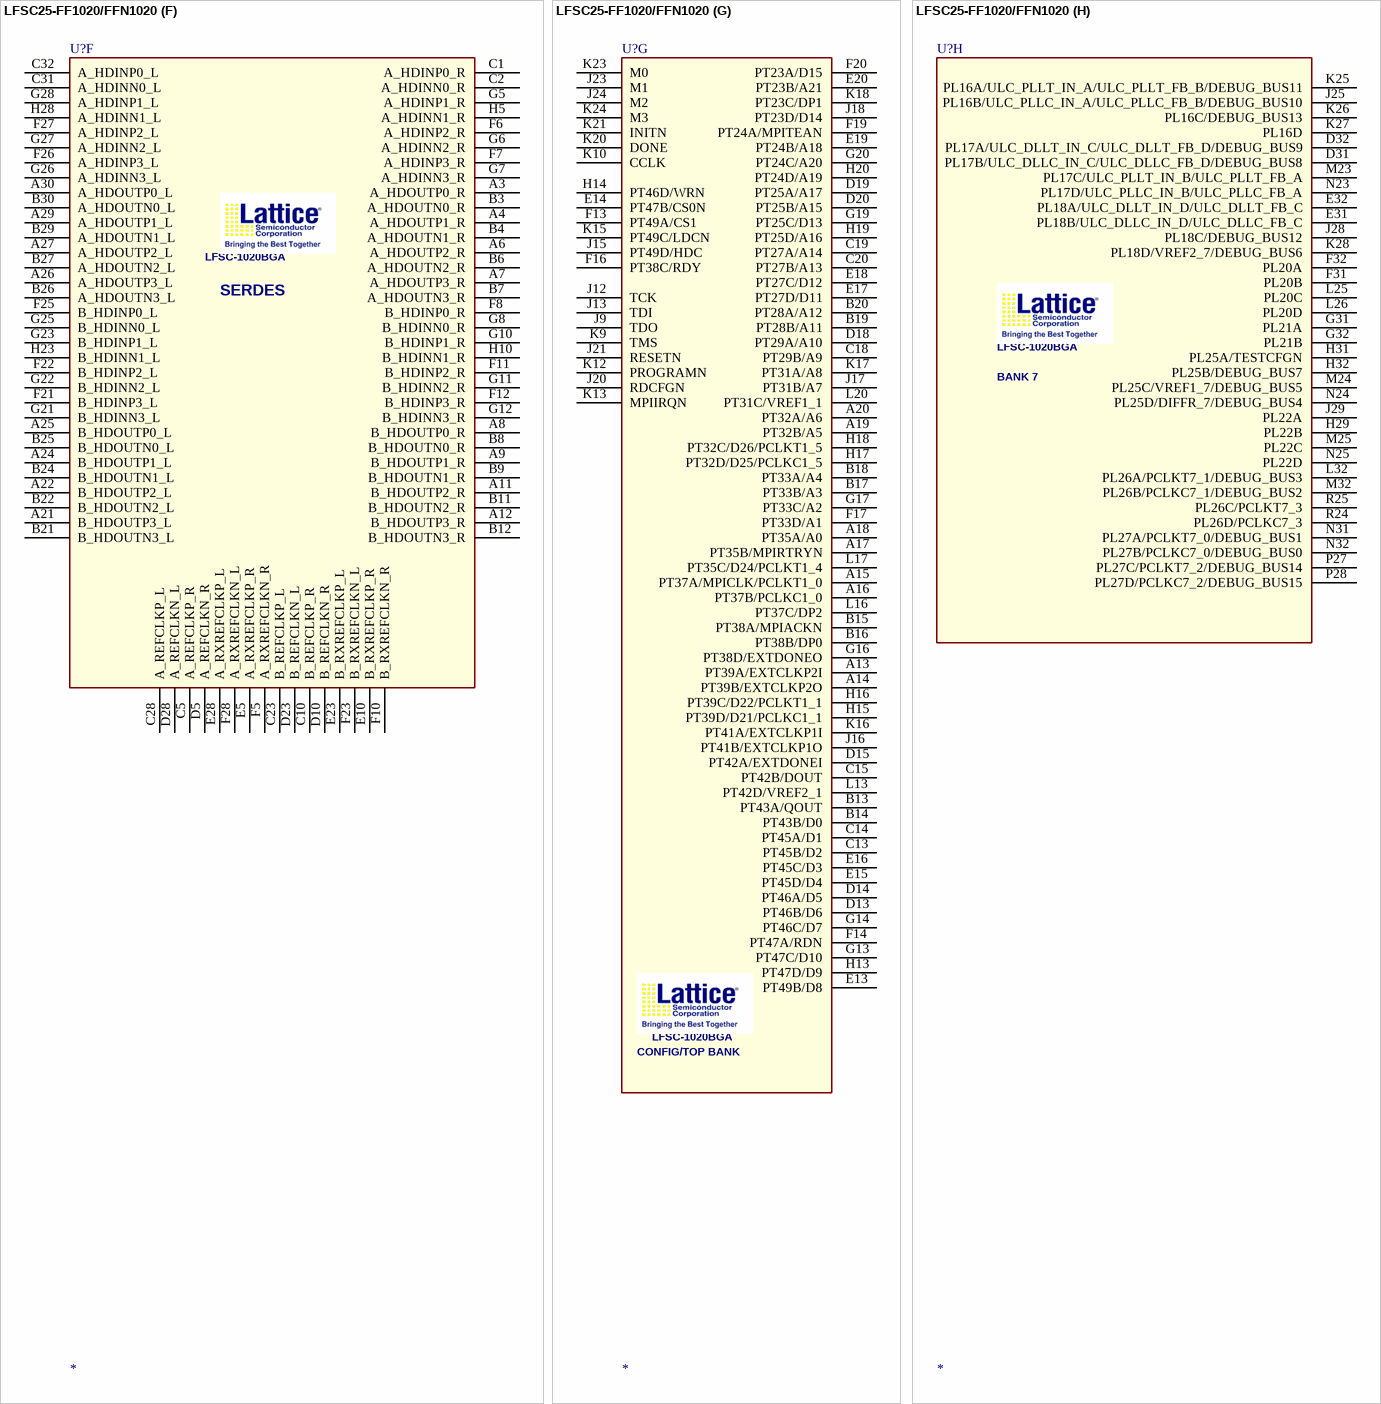
[diagram p234: symbol LFSC25-FF1020/FFN1020]
